# Altium footprint library Footprints.PcbLib: 266 footprints (part 3 of 17)
Each footprint in its own frame and in the unit in brackets; x right, y up, seen from the top. Pads: shape width x height; smd on the part's side, far side on the other; paste and mask are expansions set on the pad; w line width, h text height; cw(c..) or ccw(c..) is an arc to the next point about the centre after c.
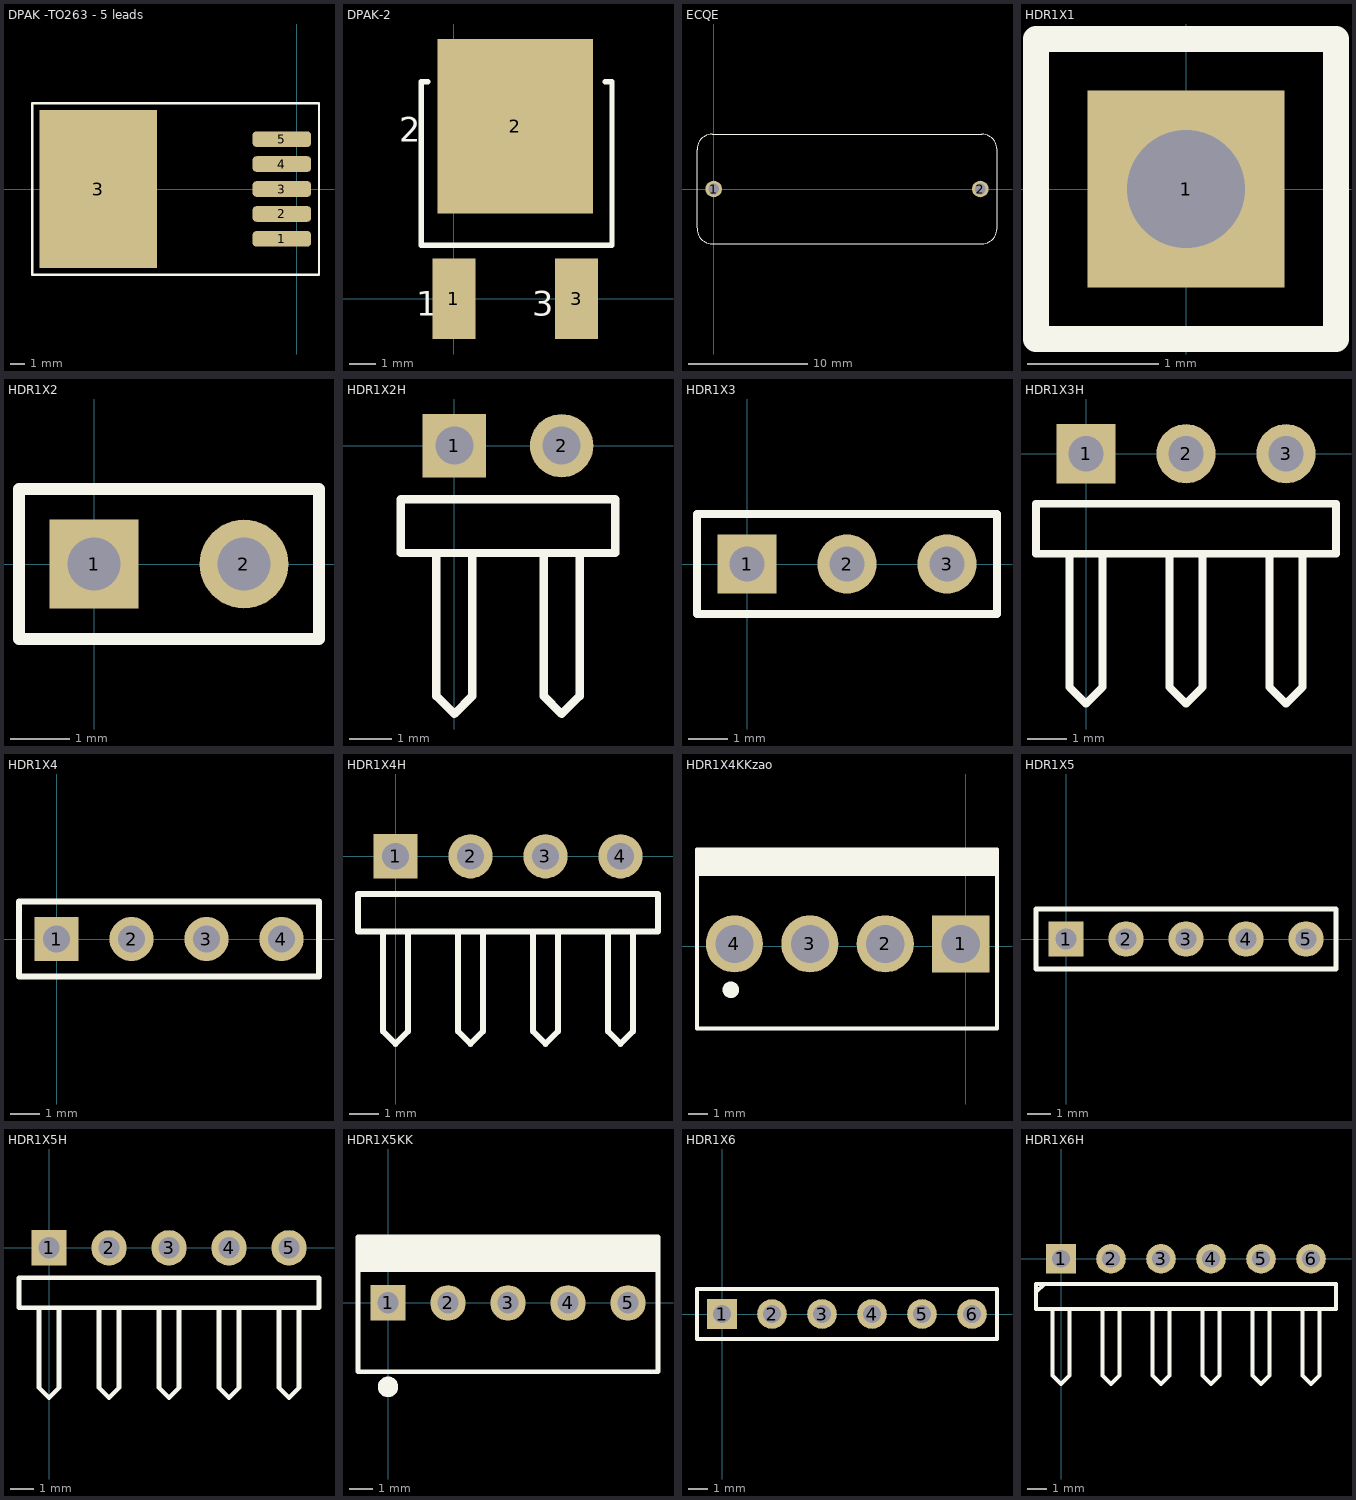
[diagram p2: the footprints below, top view; thin cyan lines are the x and y axes]

## DPAK -TO263 - 5 leads [mil]
pads (6):
  rrect50% 157.48x42 smd: 1(-39.69,-134) 2(-39.69,-67) 3(-39.69,0) 4(-39.69,67) 5(-39.69,134)
  rect 314.96x425 smd: 3(-533,0)
Top Overlay:
  lines w6: -710,-230 60,-230 60,230 -710,230 -710,-230
3D body "SW3dPS-TO263-5.STEP": height 196.17, standoff 7.19, extent -617.32,-196.84 -0.39,196.86

## DPAK-2 [mil]
pads (3):
  rect 63x118 smd: 1(0,0) 3(180,0)
  rect 228x255.91 smd: 2(90,253)
Top Overlay:
  lines w8: -37.95,318.46 -47.95,318.46 -47.95,78.47 232.05,78.47 232.05,318.46 222.05,318.46
  text "2" at -80,230 h36
  text "1" at -55,-25 h36
  text "3" at 115,-25 h36
3D body "DPAK.STEP": height 94.49, standoff 0, extent -38.84,-23.82 221,373.82

## ECQE [mm]
pads (2):
  round 1.4 hole 0.9: 1(0,0) 2(22.479,0)
Top Overlay:
  lines w0.102: -1.4,-3.327 ccw(c-0.1,-3.327) -0.097,-4.627 22.576,-4.627 ccw(c22.579,-3.327) 23.879,-3.327 ; -1.4,-3.277 -1.4,3.327 cw(c-0.1,3.327) -0.097,4.627 ; -0.097,4.626 22.576,4.626 ; 22.576,4.627 cw(c22.579,3.327) 23.879,3.327 23.879,-3.277
3D body "User Library-ECQE(F) 0_47uf 630Vdc 250Vac.step": height 20.5, standoff -3, extent -1.697,-4.65 24.303,4.65

## HDR1X1 [mm] "Connector; Header; 1 Position"
pads (1):
  rect 1.5x1.5 hole 0.9: 1(0,0)
Top Overlay:
  lines w0.2: -1.143,-1.143 1.143,-1.143 1.143,1.143 -1.143,1.143 -1.143,-1.143
3D body "Header Vertical 2_54mm 1X1.step": height 6.04, standoff -2.84, extent -1.27,-1.27 1.27,1.27

## HDR1X2 [mm] "Connector; Header; 2 Position"
pads (2):
  rect 1.5x1.5 hole 0.9: 1(0,0)
  round 1.5 hole 0.9: 2(2.54,0)
Top Overlay:
  lines w0.2: -1.27,-1.27 3.81,-1.27 3.81,1.27 -1.27,1.27 -1.27,-1.27
3D body "Header Vertical 2_54mm 2.step": height 6.04, standoff -2.84, extent -1.27,-1.27 3.81,1.27

## HDR1X2H [mm] "Connector; Header; 2 Position; Right Angle"
pads (2):
  rect 1.5x1.5 hole 0.9: 1(0,0)
  round 1.5 hole 0.9: 2(2.54,0)
Top Overlay:
  lines w0.2: -0.423,-2.54 -0.423,-5.927 0,-6.35 0.423,-5.927 0.423,-2.54 ; 2.117,-2.54 2.117,-5.927 2.54,-6.35 2.963,-5.927 2.963,-2.54 ; -1.27,-2.54 3.81,-2.54 3.81,-1.27 -1.27,-1.27 -1.27,-2.54

## HDR1X3 [mm] "Connector; Header; 3 Position"
pads (3):
  rect 1.5x1.5 hole 0.9: 1(0,0)
  round 1.5 hole 0.9: 2(2.54,0) 3(5.08,0)
Top Overlay:
  lines w0.2: -1.27,-1.27 6.35,-1.27 6.35,1.27 -1.27,1.27 -1.27,-1.27
3D body "Header Vertical 2_54mm 3.step": height 6.04, standoff -2.84, extent -1.27,-1.27 6.35,1.27

## HDR1X3H [mm] "Connector; Header; 3 Position; Right Angle"
pads (3):
  rect 1.5x1.5 hole 0.9: 1(0,0)
  round 1.5 hole 0.9: 2(2.54,0) 3(5.08,0)
Top Overlay:
  lines w0.2: -0.423,-2.54 -0.423,-5.927 0,-6.35 0.423,-5.927 0.423,-2.54 ; 2.117,-2.54 2.117,-5.927 2.54,-6.35 2.963,-5.927 2.963,-2.54 ; 4.657,-2.54 4.657,-5.927 5.08,-6.35 5.503,-5.927 5.503,-2.54 ; -1.27,-2.54 -1.27,-1.27 6.35,-1.27 6.35,-2.54 -1.27,-2.54

## HDR1X4 [mm] "Connector; Header; 4 Position"
pads (4):
  rect 1.5x1.5 hole 0.9: 1(0,0)
  round 1.5 hole 0.9: 2(2.54,0) 3(5.08,0) 4(7.62,0)
Top Overlay:
  lines w0.2: -1.27,-1.27 -1.27,1.27 8.89,1.27 8.89,-1.27 -1.27,-1.27
3D body "Header Vertical 2_54mm 4.step": height 6.04, standoff -2.84, extent -1.27,-1.27 8.89,1.27

## HDR1X4H [mm] "Connector; Header; 4 Position; Right Angle"
pads (4):
  rect 1.5x1.5 hole 0.9: 1(0,0)
  round 1.5 hole 0.9: 2(2.54,0) 3(5.08,0) 4(7.62,0)
Top Overlay:
  lines w0.2: -0.423,-2.54 -0.423,-5.927 0,-6.35 0.423,-5.927 0.423,-2.54 ; 2.117,-2.54 2.117,-5.927 2.54,-6.35 2.963,-5.927 2.963,-2.54 ; 4.657,-2.54 4.657,-5.927 5.08,-6.35 5.503,-5.927 5.503,-2.54 ; 7.197,-2.54 7.197,-5.927 7.62,-6.35 8.043,-5.927 8.043,-2.54 ; -1.27,-2.54 8.89,-2.54 8.89,-1.27 -1.27,-1.27 -1.27,-2.54

## HDR1X4KKzao [mm] "3.96"
pads (4):
  rect 3x3 hole 2: 1(-0.254,0.127)
  round 3 hole 2: 2(-4.214,0.127) 3(-8.174,0.127) 4(-12.134,0.127)
Top Overlay:
  circle w0.508: c-12.319,-2.286 r0.18
  rectangle: -14.097,3.683 1.651,5.08
  lines w0.2: -14.097,-4.318 -14.097,5.08 1.651,5.08 1.651,-4.318 -14.097,-4.318
3D body "User Library-Cvilux_CI5104P1V00.STEP": height 13.9, standoff -3.6, extent -14.172,-4.493 1.668,5.107

## HDR1X5 [mm] "Connector; Header; 5 Position"
pads (5):
  rect 1.5x1.5 hole 0.9: 1(0,0)
  round 1.5 hole 0.9: 2(2.54,0) 3(5.08,0) 4(7.62,0) 5(10.16,0)
Top Overlay:
  lines w0.2: -1.27,-1.27 11.43,-1.27 11.43,1.27 -1.27,1.27 -1.27,-1.27
3D body "User Library-Header Vertical 2_54mm Pitch2-1.step": height 6.04, standoff -2.84, extent -1.27,-1.27 11.43,1.27

## HDR1X5H [mm] "Connector; Header; 5 Position; Right Angle"
pads (5):
  rect 1.5x1.5 hole 0.9: 1(0,0)
  round 1.5 hole 0.9: 2(2.54,0) 3(5.08,0) 4(7.62,0) 5(10.16,0)
Top Overlay:
  lines w0.2: -0.423,-2.54 -0.423,-5.927 0,-6.35 0.423,-5.927 0.423,-2.54 ; 2.117,-2.54 2.117,-5.927 2.54,-6.35 2.963,-5.927 2.963,-2.54 ; 4.657,-2.54 4.657,-5.927 5.08,-6.35 5.503,-5.927 5.503,-2.54 ; 7.197,-2.54 7.197,-5.927 7.62,-6.35 8.043,-5.927 8.043,-2.54 ; 9.737,-2.54 9.737,-5.927 10.16,-6.35 10.583,-5.927 10.583,-2.54 ; -1.27,-2.54 -1.27,-1.27 11.43,-1.27 11.43,-2.54 -1.27,-2.54

## HDR1X5KK [mm] "Connector; Header; 5 Position"
pads (5):
  rect 1.5x1.5 hole 0.9: 1(0,0)
  round 1.5 hole 0.9: 2(2.54,0) 3(5.08,0) 4(7.62,0) 5(10.16,0)
Top Overlay:
  circle w0.508: c0,-3.556 r0.18
  rectangle: -1.27,1.397 11.43,2.794
  lines w0.2: -1.27,1.397 11.43,1.397 ; -1.27,-2.921 11.43,-2.921 11.43,2.794 -1.27,2.794 -1.27,-2.921
3D body "User Library-molex kk 0_1in latching 5 way vertical header.step": height 12.1, standoff -3.14, extent -1.27,-2.972 11.43,2.87

## HDR1X6 [mm] "Connector; Header; 6 Position"
pads (6):
  rect 1.5x1.5 hole 0.9: 1(0,0)
  round 1.5 hole 0.9: 2(2.54,0) 3(5.08,0) 4(7.62,0) 5(10.16,0) 6(12.7,0)
Top Overlay:
  lines w0.2: -1.27,-1.27 -1.27,1.27 13.97,1.27 13.97,-1.27 -1.27,-1.27
3D body "Header Vertical 2_54mm 6.step": height 6.04, standoff -2.84, extent -1.27,-1.27 13.97,1.27

## HDR1X6H [mm] "Connector; Header; 6 Position; Right Angle"
pads (6):
  rect 1.5x1.5 hole 0.9: 1(0,0)
  round 1.5 hole 0.9: 2(2.54,0) 3(5.08,0) 4(7.62,0) 5(10.16,0) 6(12.7,0)
Top Overlay:
  lines w0.2: -1.27,-1.693 -0.847,-1.27 ; -0.423,-2.54 -0.423,-5.927 0,-6.35 0.423,-5.927 0.423,-2.54 ; 2.117,-2.54 2.117,-5.927 2.54,-6.35 2.963,-5.927 2.963,-2.54 ; 4.657,-2.54 4.657,-5.927 5.08,-6.35 5.503,-5.927 5.503,-2.54 ; 7.197,-2.54 7.197,-5.927 7.62,-6.35 8.043,-5.927 8.043,-2.54 ; 9.737,-2.54 9.737,-5.927 10.16,-6.35 10.583,-5.927 10.583,-2.54 ; 12.277,-2.54 12.277,-5.927 12.7,-6.35 13.123,-5.927 13.123,-2.54 ; -1.27,-2.54 13.97,-2.54 13.97,-1.27 -1.27,-1.27 -1.27,-2.54